# Altium footprint library PcbLib1.PcbLib: 136 footprints (part 6 of 9)
Each footprint in its own frame and in the unit in brackets; x right, y up, seen from the top. Pads: shape width x height; smd on the part's side, far side on the other; paste and mask are expansions set on the pad; w line width, h text height; cw(c..) or ccw(c..) is an arc to the next point about the centre after c.
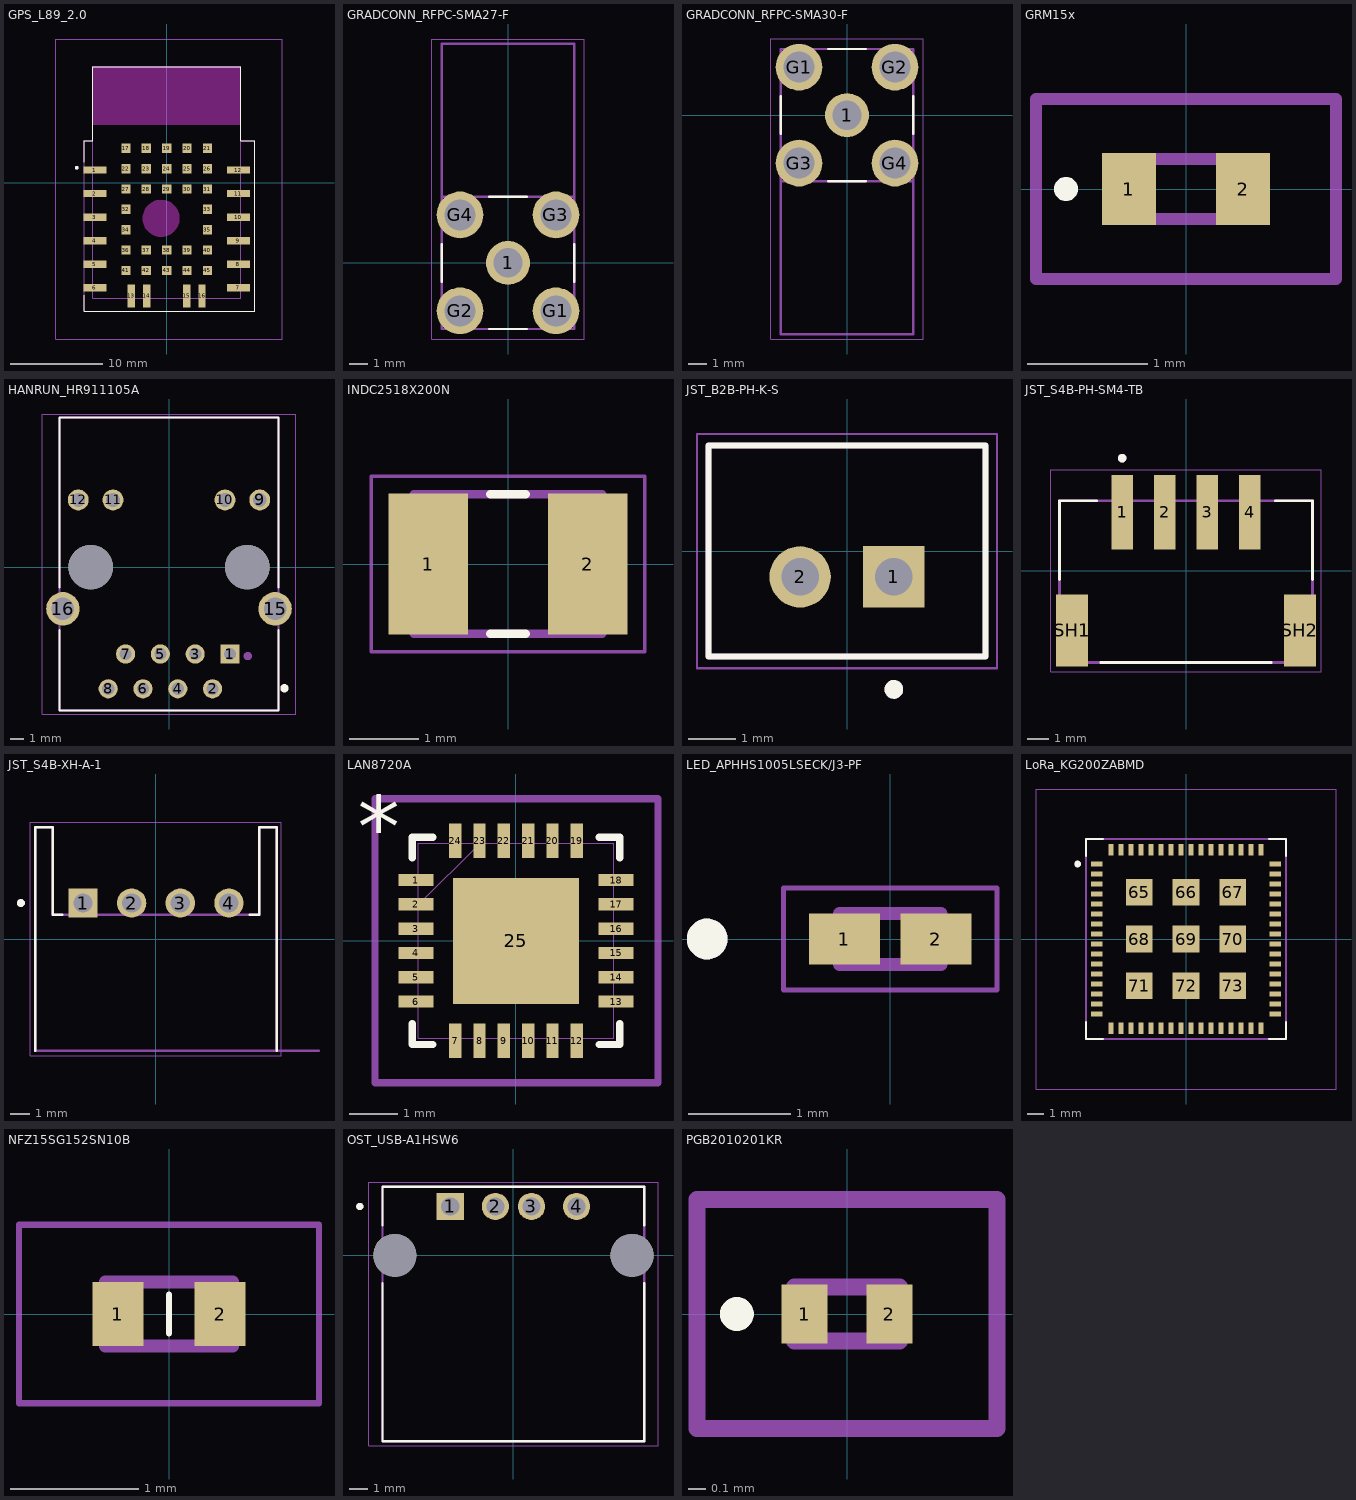
[diagram p5: the footprints below, top view; thin cyan lines are the x and y axes]

## GPS_L89_2.0 [mm]
height 7
pads (45):
  rect 2.5x0.8 smd: 1(-7.75,1.35) 2(-7.75,-1.19) 3(-7.75,-3.73) 4(-7.75,-6.27) 5(-7.75,-8.81) 6(-7.75,-11.35) 7(7.75,-11.35) 8(7.75,-8.81) 9(7.75,-6.27) 10(7.75,-3.73) 11(7.75,-1.19) 12(7.75,1.35)
  rect 0.8x2.5 smd: 13(-3.81,-12.25) 14(-2.17,-12.25) 15(2.17,-12.25) 16(3.81,-12.25)
  rect 1x1 smd: 17(-4.4,3.7) 18(-2.2,3.7) 19(0,3.7) 20(2.2,3.7) 21(4.4,3.7) 22(-4.4,1.5) 23(-2.2,1.5) 24(0,1.5) 25(2.2,1.5) 26(4.4,1.5) 27(-4.4,-0.7) 28(-2.2,-0.7) 29(0,-0.7) 30(2.2,-0.7) 31(4.4,-0.7) 32(-4.4,-2.9) 33(4.4,-2.9) 34(-4.4,-5.1) 35(4.4,-5.1) 36(-4.4,-7.3) 37(-2.2,-7.3) 38(0,-7.3) 39(2.2,-7.3) 40(4.4,-7.3) 41(-4.4,-9.5) 42(-2.2,-9.5) 43(0,-9.5) 44(2.2,-9.5) 45(4.4,-9.5)
Top Overlay:
  circle w0.2: c-9.72,1.6 r0.1
  lines w0.127: -8.91,-12.2 -8.91,-13.9 9.49,-13.9 9.49,4.5 8,4.5 8,12.5 -8,12.5 -8,4.5 -8.91,4.5 -8.91,2.2
Keep-Out Layer:
  circle w2: c-0.6,-3.87 r1
  circle w2: c-0.6,-3.87 r1
  region: 8,6.24 -8,6.24 -8,12.5 8,12.5
  region: 8,6.24 -8,6.24 -8,12.5 8,12.5
Mechanical 13:
  circle w0.2: c-9.72,1.6 r0.1
  lines w0.127: -8,4.5 -8,-12.5 8,-12.5 8,4.5 ; -8,4.5 -8,12.5 8,12.5 8,4.5 ; -8,4.5 -8.91,4.5 -8.91,-13.9 9.525,-13.9 9.525,4.5 8,4.5
Mechanical 15:
  lines w0.05: -12,-16.9 12.49,-16.9 12.49,15.5 -12,15.5 -12,-16.9
3D body "step_temp.STEP": height 7.25, standoff 0, extent -8.91,-13.9 9.49,12.5

## GRADCONN_RFPC-SMA27-F [mm]
height 10.3
pads (5):
  round 2.325 hole 1.55: 1(0,0)
  round 2.475 hole 1.65: G1(2.54,-2.54) G2(-2.54,-2.54) G3(2.54,2.54) G4(-2.54,2.54)
Top Overlay:
  lines w0.127: -3.5,-1 -3.5,1 ; -1,-3.5 1,-3.5 ; -1,3.5 1,3.5 ; 3.5,-1 3.5,1
Mechanical 13:
  lines w0.127: -3.5,3.5 3.5,3.5 ; -3.5,3.5 -3.5,-3.5 3.5,-3.5 3.5,3.5 ; -3.5,3.5 -3.5,11.6 3.5,11.6 3.5,3.5
Mechanical 15:
  lines w0.05: -4.03,-4.03 -4.03,11.85 4.03,11.85 4.03,-4.03 -4.03,-4.03
3D body "RFPC-SMA27-F--3DModel-STEP-269445.STEP": height 10, standoff -4, extent -3.5,-3.5 3.5,11.6

## GRADCONN_RFPC-SMA30-F [mm]
height 10.3
pads (5):
  round 2.325 hole 1.55: 1(0,0)
  round 2.475 hole 1.65: G1(-2.54,2.54) G2(2.54,2.54) G3(-2.54,-2.54) G4(2.54,-2.54)
Top Overlay:
  lines w0.127: -3.5,-1 -3.5,1 ; -1,-3.5 1,-3.5 ; -1,3.5 1,3.5 ; 3.5,-1 3.5,1
Mechanical 13:
  lines w0.127: -3.5,-3.5 -3.5,3.5 3.5,3.5 3.5,-3.5 ; -3.5,-3.5 3.5,-3.5 ; -3.5,-3.5 -3.5,-11.6 3.5,-11.6 3.5,-3.5
Mechanical 15:
  lines w0.05: -4.03,-11.85 -4.03,4.03 4.03,4.03 4.03,-11.85 -4.03,-11.85

## GRM15x [mm]
pads (2):
  rect 0.45x0.6 smd: 1(-0.475,0) 2(0.475,0)
Top Overlay:
  lines w0.1: -1,-0.05 cw(c-1,0) -1,0.05 cw(c-1,0) -1,-0.05
Mechanical 13:
  lines w0.1: -0.5,-0.25 0.5,-0.25 0.5,0.25 -0.5,0.25 -0.5,-0.25
Mechanical 15:
  lines w0.1: -1.25,-0.75 1.25,-0.75 1.25,0.75 -1.25,0.75 -1.25,-0.75
3D body "GRM155R61A106ME11D.stp": height 0.5, standoff 0, extent -0.5,-0.28 0.5,0.27

## HANRUN_HR911105A [mm]
pads (16):
  rect 1.398x1.398 / inner round 1.398 / far side rect 1.398x1.398 hole 0.89: 1(4.45,-6.35)
  round 1.398 hole 0.89: 2(3.18,-8.89) 3(1.91,-6.35) 4(0.64,-8.89) 5(-0.63,-6.35) 6(-1.9,-8.89) 7(-3.17,-6.35) 8(-4.44,-8.89)
  round 1.53 hole 1.02: 9(6.625,4.9) 10(4.085,4.9) 11(-4.085,4.9) 12(-6.625,4.9)
  round 2.445 hole 1.63: 15(7.745,-3.05) 16(-7.745,-3.05)
  round 3.25 hole 3.25 unplated: ""(-5.715,0) ""(5.715,0)
Top Overlay:
  circle w0.3: c8.425,-8.85 r0.15
  lines w0.127: -8,-4.6 -8,-10.48 8,-10.48 8,-4.6 ; -8,-1.5 -8,10.92 8,10.92 8,-1.5
Mechanical 13:
  circle w0.3: c5.75,-6.5 r0.15
  lines w0.127: -8,-10.48 8,-10.48 8,10.92 -8,10.92 -8,-10.48
Mechanical 15:
  lines w0.05: -9.25,-10.73 9.25,-10.73 9.25,11.17 -9.25,11.17 -9.25,-10.73
3D body "step_temp.STEP": height 13.5, standoff -3.05, extent -7.995,-10.4 8.045,10.9

## INDC2518X200N [mm]
pads (2):
  rect 1.14x2.02 smd: 1(-1.14,0) 2(1.14,0)
Top Overlay:
  lines w0.127: -0.25,-1 0.25,-1 ; -0.25,1 0.25,1
Mechanical 13:
  lines w0.127: -1.35,-1 1.35,-1 1.35,1 -1.35,1 -1.35,-1
Mechanical 15:
  lines w0.05: -1.958,-1.258 1.958,-1.258 1.958,1.258 -1.958,1.258 -1.958,-1.258
3D body "step_temp.STEP": height 2, standoff 0, extent -1.25,-0.9 1.25,0.9

## JST_B2B-PH-K-S [mm]
pads (2):
  rect 1.308x1.308 / inner round 1.308 / far side rect 1.308x1.308 hole 0.8: 1(1,-0.55)
  round 1.308 hole 0.8: 2(-1,-0.55)
Top Overlay:
  circle w0.2: c1,-2.95 r0.1
  lines w0.127: -2.95,-2.25 2.95,-2.25 2.95,2.25 -2.95,2.25 -2.95,-2.25
Mechanical 13:
  circle w0.2: c1,-2.95 r0.1
  lines w0.127: -2.95,-2.25 -2.95,2.25 2.95,2.25 2.95,-2.25 -2.95,-2.25
Mechanical 15:
  lines w0.05: -3.2,-2.5 -3.2,2.5 3.2,2.5 3.2,-2.5 -3.2,-2.5
3D body "step_temp.STEP": height 6, standoff -3.4, extent -2.95,-2.25 2.95,2.25

## JST_S4B-PH-SM4-TB [mm]
height 5.5
pads (6):
  rect 1x3.5 smd: 1(-3,2.75) 2(-1,2.75) 3(1,2.75) 4(3,2.75)
  rect 1.5x3.4 smd: SH1(-5.35,-2.8) SH2(5.35,-2.8)
Top Overlay:
  circle w0.2: c-3,5.3 r0.1
  lines w0.127: -5.95,-0.4 -5.95,3.3 -4.2,3.3 ; -4,-4.3 4,-4.3 ; 4.2,3.3 5.95,3.3 5.95,-0.4
Mechanical 13:
  circle w0.2: c-3,5.3 r0.1
  lines w0.127: -5.95,-4.3 5.95,-4.3 5.95,3.3 -5.95,3.3 -5.95,-4.3
Mechanical 15:
  lines w0.05: -6.35,-4.75 -6.35,4.75 6.35,4.75 6.35,-4.75 -6.35,-4.75
3D body "step_temp.STEP": height 5.5, standoff -0.1, extent -5.95,-4.3 5.95,4.3

## JST_S4B-XH-A-1 [mm]
height 6.1
pads (4):
  rect 1.508x1.508 / inner round 1.508 / far side rect 1.508x1.508 hole 1: 1(-3.75,1.85)
  round 1.508 hole 1: 2(-1.25,1.85) 3(1.25,1.85) 4(3.75,1.85)
Top Overlay:
  circle w0.2: c-6.94,1.85 r0.1
  lines w0.127: -6.2,-5.75 -6.2,5.75 -5.3,5.75 -5.3,1.25 -4.82,1.25 ; 4.82,1.25 5.3,1.25 5.3,5.75 6.2,5.75 6.2,-5.75
Mechanical 13:
  circle w0.2: c-6.94,1.85 r0.1
  lines w0.127: 8.38,-5.75 6.2,-5.75 ; 6.2,-5.75 -6.2,-5.75 -6.2,5.75 -5.3,5.75 -5.3,1.25 5.3,1.25 5.3,5.75 6.2,5.75 6.2,-5.75
  text "PCB Edge" at 6.667,-5.453 h0.81
Mechanical 15:
  lines w0.05: -6.45,-6 -6.45,6 6.45,6 6.45,-6 -6.45,-6
3D body "step_temp.STEP": height 6.1, standoff -3.4, extent -6.2,-5.75 6.2,5.75

## LAN8720A [mil]
pads (25):
  rect 28x10 smd paste+0 mask+0: 1(-81,49.21) 2(-81,29.53) 3(-81,9.84) 4(-81,-9.84) 5(-81,-29.53) 6(-81,-49.21) 13(81,-49.21) 14(81,-29.53) 15(81,-9.84) 16(81,9.84) 17(81,29.53) 18(81,49.21)
  rect 10x28 smd paste+0 mask+0: 7(-49.21,-81) 8(-29.53,-81) 9(-9.84,-81) 10(9.84,-81) 11(29.53,-81) 12(49.21,-81) 19(49.21,81) 20(29.53,81) 21(9.84,81) 22(-9.84,81) 23(-29.53,81) 24(-49.21,81)
  rect 102x102 smd paste-51 mask+0: 25(0,0)
Top Overlay:
  lines w6: -84,-67.31 -84,-84 -67.31,-84 ; -84,67.31 -84,84 -67.31,84 ; 67.31,-84 84,-84 84,-67.31 ; 67.31,84 84,84 84,67.31
  text "*" at -127.95,67.91 h50
Top Paste:
  region: -3.94,47.06 -47.06,47.06 -47.06,3.94 -3.94,3.94
  region: -3.94,-3.94 -47.06,-3.94 -47.06,-47.06 -3.94,-47.06
  region: 47.06,47.06 3.94,47.06 3.94,3.94 47.06,3.94
  region: 47.06,-3.94 3.94,-3.94 3.94,-47.06 47.06,-47.06
Mechanical 13:
  lines w1: -79,29 -29,79 ; -79,-79 79,-79 79,79 -79,79 -79,-79 ; -79,-55.21 -79,-43.21 -79,-55.21 ; -79,-35.53 -79,-23.53 -79,-35.53 ; -79,-15.84 -79,-3.84 -79,-15.84 ; -79,3.84 -79,15.84 -79,3.84 ; -79,23.53 -79,35.53 -79,23.53 ; -79,43.21 -79,55.21 -79,43.21 ; -55.21,-79 -43.21,-79 -55.21,-79 ; -55.21,79 -43.21,79 -55.21,79 ; -35.53,-79 -23.53,-79 -35.53,-79 ; -35.53,79 -23.53,79 -35.53,79 ; -15.84,-79 -3.84,-79 -15.84,-79 ; -15.84,79 -3.84,79 -15.84,79 ; 3.84,-79 15.84,-79 3.84,-79 ; 3.84,79 15.84,79 3.84,79 ; 23.53,-79 35.53,-79 23.53,-79 ; 23.53,79 35.53,79 23.53,79 ; 43.21,-79 55.21,-79 43.21,-79 ; 43.21,79 55.21,79 43.21,79 ; 79,-55.21 79,-43.21 79,-55.21 ; 79,-35.53 79,-23.53 79,-35.53 ; 79,-15.84 79,-3.84 79,-15.84 ; 79,3.84 79,15.84 79,3.84 ; 79,23.53 79,35.53 79,23.53 ; 79,43.21 79,55.21 79,43.21
  text "*" at -79.5,34.06 h50
  text "RefDes2" at -16.73,-63.98 h10
Mechanical 15:
  lines w6: -114.17,-115 -114.17,-73.39 -114.17,74.21 -114.17,99 -114.17,115 115,115 115,99 115,74.21 115,-74.21 115,-83 115,-115 -74.21,-115 -114.17,-115
3D body "QFN24-6X6_MC_MCH.step": height 36.1, standoff 0, extent -79.02,-79.02 79.02,79.02

## LED_APHHS1005LSECK/J3-PF [mm]
height 0.25
pads (2):
  rect 0.7x0.5 smd mask+0.05: 1(-0.45,0) 2(0.45,0)
Top Overlay:
  circle w0.2: c-1.8,0 r0.1
Mechanical 13:
  circle w0.2: c-1.8,0 r0.1
  lines w0.127: -0.5,-0.25 0.5,-0.25 0.5,0.25 -0.5,0.25 -0.5,-0.25
Mechanical 15:
  lines w0.05: -1.05,-0.5 -1.05,0.5 1.05,0.5 1.05,-0.5 -1.05,-0.5
3D body "step_temp.STEP": height 0.5, standoff 0, extent -0.5,-0.25 0.5,0.25

## LoRa_KG200ZABMD [mm]
height 2
pads (73):
  rect 0.7x0.3 smd: 1(-5.35,4.5) 2(-5.35,3.9) 3(-5.35,3.3) 4(-5.35,2.7) 5(-5.35,2.1) 6(-5.35,1.5) 7(-5.35,0.9) 8(-5.35,0.3) 9(-5.35,-0.3) 10(-5.35,-0.9) 11(-5.35,-1.5) 12(-5.35,-2.1) 13(-5.35,-2.7) 14(-5.35,-3.3) 15(-5.35,-3.9) 16(-5.35,-4.5) 33(5.35,-4.5) 34(5.35,-3.9) 35(5.35,-3.3) 36(5.35,-2.7) 37(5.35,-2.1) 38(5.35,-1.5) 39(5.35,-0.9) 40(5.35,-0.3) 41(5.35,0.3) 42(5.35,0.9) 43(5.35,1.5) 44(5.35,2.1) 45(5.35,2.7) 46(5.35,3.3) 47(5.35,3.9) 48(5.35,4.5)
  rect 0.3x0.7 smd: 17(-4.5,-5.35) 18(-3.9,-5.35) 19(-3.3,-5.35) 20(-2.7,-5.35) 21(-2.1,-5.35) 22(-1.5,-5.35) 23(-0.9,-5.35) 24(-0.3,-5.35) 25(0.3,-5.35) 26(0.9,-5.35) 27(1.5,-5.35) 28(2.1,-5.35) 29(2.7,-5.35) 30(3.3,-5.35) 31(3.9,-5.35) 32(4.5,-5.35) 49(4.5,5.35) 50(3.9,5.35) 51(3.3,5.35) 52(2.7,5.35) 53(2.1,5.35) 54(1.5,5.35) 55(0.9,5.35) 56(0.3,5.35) 57(-0.3,5.35) 58(-0.9,5.35) 59(-1.5,5.35) 60(-2.1,5.35) 61(-2.7,5.35) 62(-3.3,5.35) 63(-3.9,5.35) 64(-4.5,5.35)
  rect 1.6x1.6 smd: 65(-2.8,2.8) 66(0,2.8) 67(2.8,2.8) 68(-2.8,0) 69(0,0) 70(2.8,0) 71(-2.8,-2.8) 72(0,-2.8) 73(2.8,-2.8)
Top Overlay:
  circle w0.2: c-6.5,4.5 r0.1
  lines w0.127: -6,-4.97 -6,-6 -4.97,-6 ; -6,4.97 -6,6 -4.97,6 ; 4.97,-6 6,-6 6,-4.97 ; 4.97,6 6,6 6,4.97
Mechanical 13:
  circle w0.2: c-6.5,4.5 r0.1
  lines w0.127: -6,-6 6,-6 6,6 -6,6 -6,-6
Mechanical 15:
  lines w0.05: -9,-9 -9,9 9,9 9,-9 -9,-9
3D body "step_temp.STEP": height 2, standoff 0, extent -6,-6 6,6

## NFZ15SG152SN10B [mm]
pads (2):
  rect 0.4x0.5 smd: 1(-0.4,0) 2(0.4,0)
Top Overlay:
  lines w0.05: 0,-0.15 0,0.15
Mechanical 13:
  lines w0.1: -0.5,-0.25 0.5,-0.25 0.5,0.25 -0.5,0.25 -0.5,-0.25
Mechanical 15:
  lines w0.05: -1.175,-0.7 1.175,-0.7 1.175,0.7 -1.175,0.7 -1.175,-0.7
3D body "BLM15AG601SN1D.stp": height 0.5, standoff 0, extent -0.5,-0.25 0.5,0.25

## OST_USB-A1HSW6 [mm]
height 7.1
pads (6):
  rect 1.508x1.508 / inner round 1.508 / far side rect 1.508x1.508 hole 1: 1(-3.5,2.71)
  round 1.508 hole 1: 2(-1,2.71) 3(1,2.71) 4(3.5,2.71)
  round 2.38 hole 2.38 unplated: ""(-6.57,0) ""(6.57,0)
Top Overlay:
  circle w0.2: c-8.51,2.71 r0.1
  lines w0.127: -7.25,-1.55 -7.25,-10.3 7.25,-10.3 7.25,-1.55 ; -7.25,1.65 -7.25,3.8 7.25,3.8 7.25,1.65
Mechanical 13:
  circle w0.2: c-8.51,2.71 r0.1
  lines w0.127: -7.25,-10.3 -7.25,3.8 7.25,3.8 7.25,-10.3 -7.25,-10.3
Mechanical 15:
  lines w0.05: -8.01,-10.55 8.01,-10.55 8.01,4.05 -8.01,4.05 -8.01,-10.55

## PCBComponent_1 [mm]

## PGB2010201KR [mm]
pads (2):
  rect 0.27x0.35 smd: 1(-0.25,0) 2(0.25,0)
Top Overlay:
  lines w0.1: -0.65,-0.05 ccw(c-0.65,0) -0.65,0.05 ccw(c-0.65,0) -0.65,-0.05
Mechanical 13:
  lines w0.1: -0.31,-0.16 -0.31,0.16 0.31,0.16 0.31,-0.16 -0.31,-0.16
Mechanical 15:
  lines w0.1: -0.885,-0.675 -0.885,0.675 0.885,0.675 0.885,-0.675 -0.885,-0.675
3D body "PGB2010201KR-06NR.stp": height 0.36, standoff 0, extent -0.33,-0.178 0.33,0.178